# Altium footprint library CONN_RJ.PcbLib: 38 footprints (part 1 of 3)
Each footprint in its own frame and in the unit in brackets; x right, y up, seen from the top. Pads: shape width x height; smd on the part's side, far side on the other; paste and mask are expansions set on the pad; w line width, h text height; cw(c..) or ccw(c..) is an arc to the next point about the centre after c.
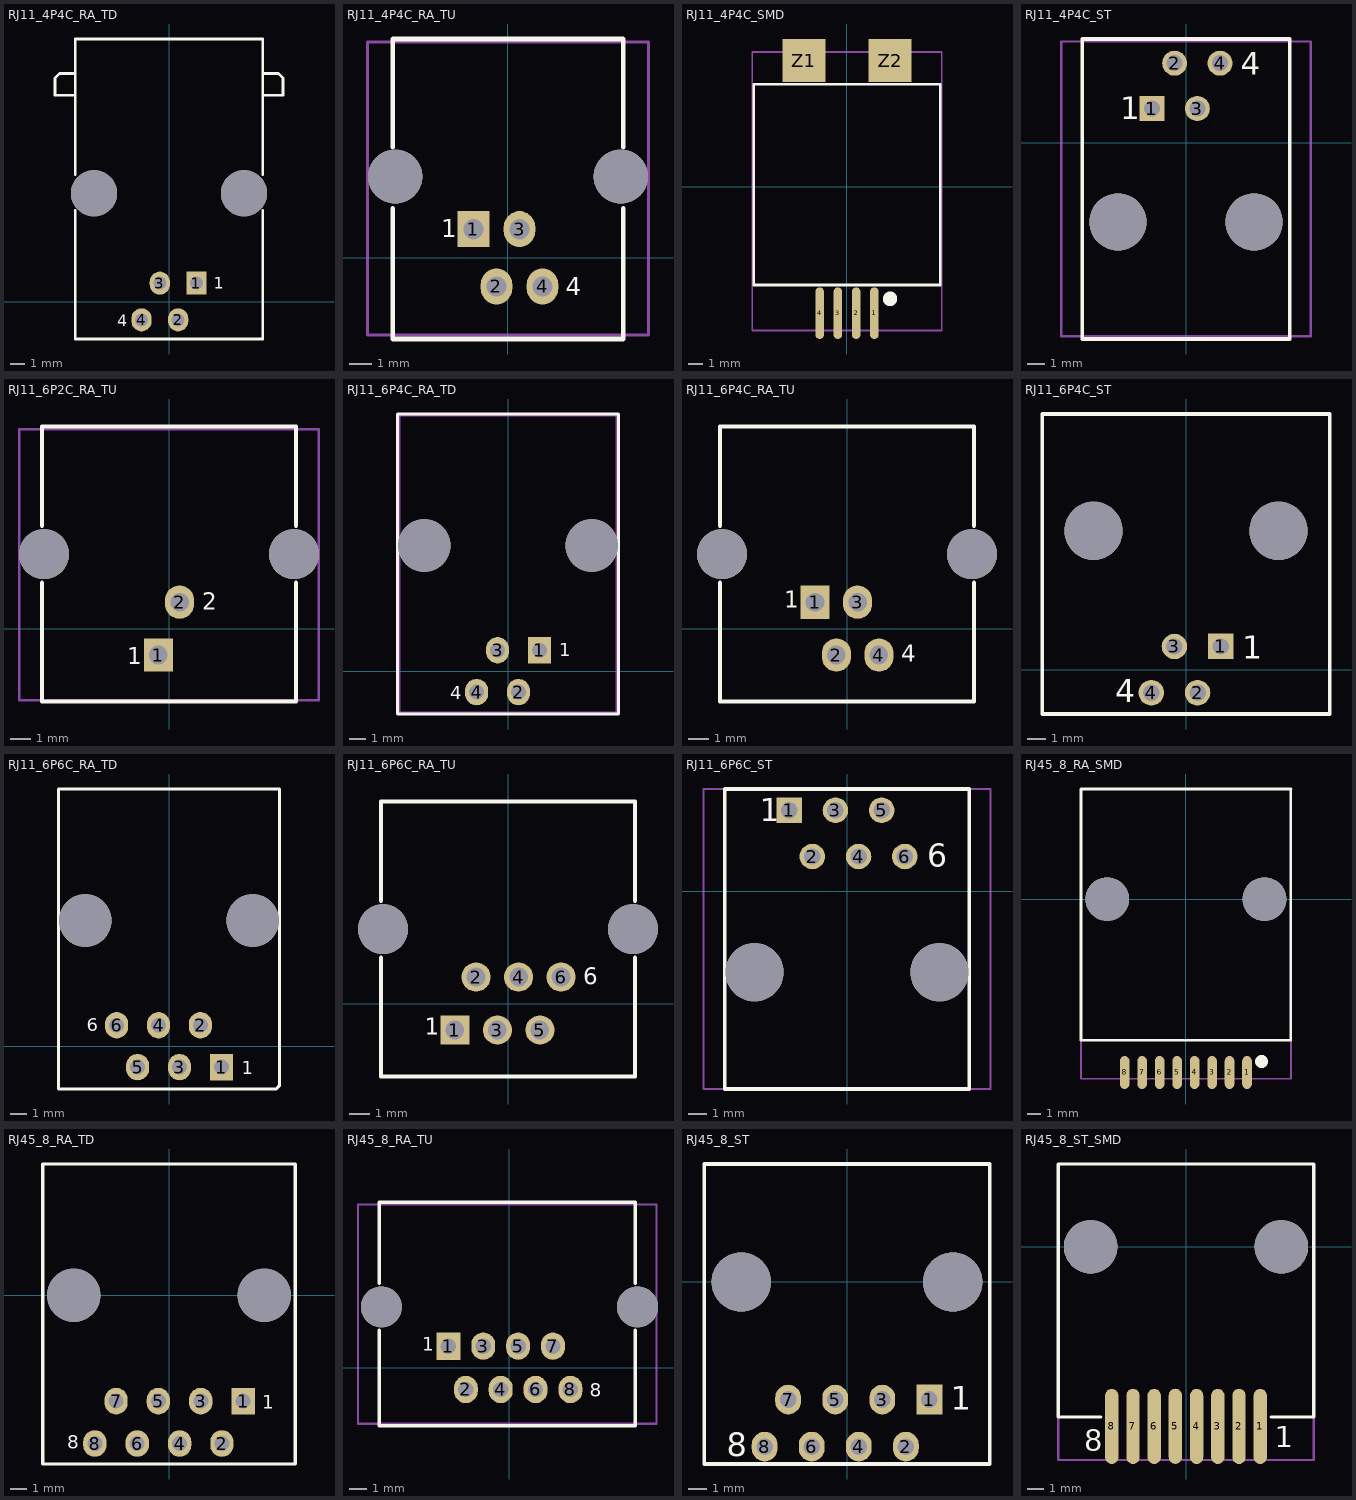
[diagram p0: the footprints below, top view; thin cyan lines are the x and y axes]

## RJ11_4P4C_RA_TD [mm] "RJ11 4P4C, RightAngle, TabDown"
height 14.5
pads (6):
  rect 1.4x1.6 hole 0.9: 1(1.905,1.27)
  oval 1.4x1.6 hole 0.9: 2(0.635,-1.27) 3(-0.635,1.27) 4(-1.905,-1.27)
  round 3.2 hole 3.2 unplated: ""(-5.2,7.5) ""(5.2,7.5)
Top Overlay:
  lines w0.2: -6.5,6.3 -6.5,-2.6 6.5,-2.6 6.5,6.3 ; -6.5,8.8 -6.5,18.2 6.5,18.2 6.5,8.8 ; -6.5,14.3 -7.9,14.3 -7.9,15.5 -7.6,15.8 -6.5,15.8 ; 6.5,14.3 7.9,14.3 7.9,15.5 7.6,15.8 6.5,15.8
  text "4" at -3.6,-1.7 h0.8
  text "1" at 3.1,0.9 h0.8
3D body "ACC-M-RJE02-164-0X21-REVT1.step": height 15.83, standoff -3.82, extent -7.775,-2.5 7.975,18.07

## RJ11_4P4C_RA_TU [mm] "RJ11 4P4C, RightAngle, TabUp"
height 14.5
pads (6):
  rect 1.4x1.6 hole 0.9: 1(-1.53,1.27)
  oval 1.4x1.6 hole 0.9: 2(-0.51,-1.27) 3(0.51,1.27) 4(1.53,-1.27)
  round 2.4 hole 2.4 unplated: ""(-5,3.6) ""(5,3.6)
Top Overlay:
  lines w0.2: -5.1,2.2 -5.1,-3.6 5.1,-3.6 5.1,2.2 ; -5.1,4.9 -5.1,9.7 5.1,9.7 5.1,4.9
  text "1" at -2.95,0.9 h0.8
  text "4" at 2.55,-1.65 h0.8
Mechanical 13:
  lines w0.127: -6.23,-3.43 -6.23,9.57 6.231,9.57 6.231,-3.43 -6.23,-3.43
3D body "615004143821.stp": height 3, standoff -14.95, extent -6.275,-3.43 6.275,9.57

## RJ11_4P4C_SMD [mm] "RJ11 4P4C, Tab Up, Straight, Top Entry_4P4C T&R with Mylar for Pick & Place"
height 12.9
pads (6):
  oval 0.6x3.6 smd: 1(1.905,-8.8) 2(0.635,-8.8) 3(-0.635,-8.8) 4(-1.905,-8.8)
  rect 3x3 smd: Z1(-3,8.8) Z2(3,8.8)
Top Overlay:
  circle w0.8: c3,-7.8 r0.1
  lines w0.2: -6.5,-6.85 6.5,-6.85 6.5,7.15 -6.5,7.15 -6.5,-6.85
Mechanical 13:
  lines w0.127: -6.6,-10 -6.6,9.4 6.6,9.4 6.6,-10 -6.6,-10
3D body "634104149621.stp": height 13, standoff 0.02, extent -6.6,-10 6.6,9.4

## RJ11_4P4C_ST [mm] "RJ11 4P4C, Straight, WURTH 615004144021"
height 15.88
pads (6):
  rect 1.4x1.4 hole 0.9: 1(-1.905,1.905)
  round 1.4 hole 0.9: 2(-0.635,4.445) 3(0.635,1.905) 4(1.905,4.445)
  round 3.2 hole 3.2 unplated: ""(-3.81,-4.445) ""(3.81,-4.445)
Top Overlay:
  lines w0.2: -5.8,-11 -5.8,5.8 5.8,5.8 5.8,-11 -5.8,-11
  text "4" at 3.06,3.805 h1.27
  text "1" at -3.69,1.305 h1.27
Mechanical 13:
  lines w0.127: -6.985,-10.845 -6.985,5.655 6.985,5.655 6.985,-10.845 -6.985,-10.845
3D body "615004144021.stp": height 16.36, standoff -3.32, extent -6.985,-10.845 6.985,5.655

## RJ11_6P2C_RA_TU [mm] "RJ11, 6P2C, RightAngle TabUp, WURTH 615002138421"
height 14.5
pads (4):
  rect 1.4x1.6 hole 0.9: 1(-0.51,-1.27)
  oval 1.4x1.6 hole 0.9: 2(0.51,1.27)
  round 2.4 hole 2.4 unplated: ""(-6,3.57) ""(6,3.57)
Top Overlay:
  lines w0.2: -6.1,2.2 -6.1,-3.5 6.1,-3.5 6.1,2.2 ; -6.1,4.94 -6.1,9.7 6.1,9.7 6.1,4.94
  text "1" at -2,-1.7 h0.8
  text "2" at 1.6,0.9 h0.8
Mechanical 13:
  lines w0.12: -7.19,-3.43 7.19,-3.43 7.19,9.57 -7.19,9.57 -7.19,-3.43
3D body "615002138421.stp": height 14.51, standoff -3.39, extent -7.19,-3.43 7.19,9.57

## RJ11_6P4C_RA_TD [mm] "RJ11 6P4C, RightAngle, TabDown, WURTH 615004141121"
height 11.65
pads (6):
  rect 1.4x1.6 hole 0.9: 1(1.905,1.27)
  oval 1.4x1.6 hole 0.9: 2(0.635,-1.27) 3(-0.635,1.27) 4(-1.905,-1.27)
  round 3.2 hole 3.2 unplated: ""(-5.08,7.62) ""(5.08,7.62)
Top Overlay:
  lines w0.2: -6.7,-2.6 -6.7,15.6 6.7,15.6 6.7,-2.6 -6.7,-2.6
  text "4" at -3.5,-1.7 h0.8
  text "1" at 3.1,0.9 h0.8
Mechanical 15:
  lines w0.127: -6.6,-2.5 6.6,-2.5 6.6,15.5 -6.6,15.5 -6.6,-2.5
3D body "615004141121.stp": height 2.87, standoff -12.08, extent -6.6,-2.5 6.6,15.5

## RJ11_6P4C_RA_TU [mm] "RJ11, 6P4C, RightAngle TabUp, WURTH 615004138421"
height 14.5
pads (6):
  rect 1.4x1.6 hole 0.9: 1(-1.53,1.27)
  oval 1.4x1.6 hole 0.9: 2(-0.51,-1.27) 3(0.51,1.27) 4(1.53,-1.27)
  round 2.4 hole 2.4 unplated: ""(-6,3.57) ""(6,3.57)
Top Overlay:
  lines w0.2: -6.1,2.2 -6.1,-3.5 6.1,-3.5 6.1,2.2 ; -6.1,4.94 -6.1,9.7 6.1,9.7 6.1,4.94
  text "1" at -3,1 h0.8
  text "4" at 2.6,-1.6 h0.8
3D body "615004138421.stp": height 2.97, standoff -14.93, extent -7.189,-3.43 7.192,9.57

## RJ11_6P4C_ST [mm] "RJ11, 6P4C, Straight, WURTH 615004144121"
height 16.38
pads (6):
  rect 1.4x1.4 hole 0.9: 1(1.905,1.27)
  round 1.4 hole 0.9: 2(0.635,-1.27) 3(-0.635,1.27) 4(-1.905,-1.27)
  round 3.2 hole 3.2 unplated: ""(-5.08,7.62) ""(5.08,7.62)
Top Overlay:
  lines w0.2: -7.887,-2.44 -7.887,14.04 ; -7.887,-2.44 7.887,-2.44 ; -7.887,-2.44 -7.887,14.04 ; -7.887,-2.44 7.887,-2.44 ; -7.887,14.04 7.887,14.04 ; -7.887,14.04 7.887,14.04 ; 7.887,-2.44 7.887,14.04 ; 7.887,-2.44 7.887,14.04
  text "4" at -3.9,-1.8 h1.27
  text "1" at 3.1,0.6 h1.27
3D body "615004144121.stp": height 15.95, standoff -3.73, extent -7.813,-2.44 7.887,14.04

## RJ11_6P6C_RA_TD [mm] "RJ11 6P6C, RightAngle, TabDown, WURTH 615004141121"
height 11.65
pads (8):
  rect 1.4x1.6 hole 0.9: 1(3.175,-1.27)
  oval 1.4x1.6 hole 0.9: 2(1.905,1.27) 3(0.635,-1.27) 4(-0.635,1.27) 5(-1.905,-1.27) 6(-3.175,1.27)
  round 3.2 hole 3.2 unplated: ""(-5.08,7.62) ""(5.08,7.62)
Top Overlay:
  lines w0.2: -6.7,-2.6 -6.7,15.6 6.7,15.6 6.7,-2.4 6.5,-2.6 -6.7,-2.6
  text "6" at -5,0.9 h0.8
  text "1" at 4.4,-1.7 h0.8
3D body "615006141121.stp": height 11.66, standoff -3.29, extent -6.6,-2.5 6.6,15.5

## RJ11_6P6C_RA_TU [mm] "RJ11, 6P6C, RightAngle TabUp, WURTH 615006138421"
height 14.5
pads (8):
  rect 1.4x1.4 hole 0.9: 1(-2.55,-1.27)
  round 1.4 hole 0.9: 2(-1.53,1.27) 3(-0.51,-1.27) 4(0.51,1.27) 5(1.53,-1.27) 6(2.55,1.27)
  round 2.4 hole 2.4 unplated: ""(-6,3.57) ""(6,3.57)
Top Overlay:
  lines w0.2: -6.1,2.2 -6.1,-3.5 6.1,-3.5 6.1,2.2 ; -6.1,4.94 -6.1,9.7 6.1,9.7 6.1,4.94
  text "1" at -4,-1.5 h0.8
  text "6" at 3.6,0.9 h0.8
3D body "615006138421.stp": height 14.51, standoff -3.39, extent -7.19,-3.43 7.19,9.57

## RJ11_6P6C_ST [mm] "RJ11, 6P6C, Straight, WURTH 615006144121"
height 16.38
pads (8):
  rect 1.4x1.4 hole 0.9: 1(-3.175,4.445)
  round 1.4 hole 0.9: 2(-1.905,1.905) 3(-0.635,4.445) 4(0.635,1.905) 5(1.905,4.445) 6(3.175,1.905)
  round 3.2 hole 3.2 unplated: ""(-5.08,-4.445) ""(5.08,-4.445)
Top Overlay:
  lines w0.2: -6.725,-10.865 -6.725,5.615 6.725,5.615 6.725,-10.865 -6.725,-10.865
  text "6" at 4.4,1.335 h1.27
  text "1" at -4.8,3.835 h1.27
Mechanical 13:
  lines w0.127: -7.887,-10.865 -7.887,5.615 7.887,5.615 7.887,-10.865 -7.887,-10.865
3D body "615006144121.stp": height 15.95, standoff -3.73, extent -7.887,-10.865 7.813,5.615

## RJ45_8_RA_SMD [mm] "RJ45 8P8C, RightAngle, TabDown SMD, WURTH 634008137221"
height 12.6
pads (10):
  oval 0.7x2.4 smd: 1(4.445,-12.6) 2(3.175,-12.6) 3(1.905,-12.6) 4(0.635,-12.6) 5(-0.635,-12.6) 6(-1.905,-12.6) 7(-3.175,-12.6) 8(-4.445,-12.6)
  round 3.17 hole 3.17 unplated: ""(-5.715,0) ""(5.715,0)
Top Overlay:
  circle w0.5: c5.5,-11.8 r0.224
  lines w0.2: -7.62,-8 -7.62,8 ; 7.62,8 7.62,-10.26 -7.62,-10.26 -7.62,8 ; 7.64,8 -7.62,8
Mechanical 13:
  lines w0.12: 7.64,8 -7.62,8 -7.62,-13.059 7.62,-13.059 7.64,-13.039 7.64,8 ; 7.64,8 7.64,8
3D body "634008137221.stp": height 2.96, standoff -13.4, extent -7.62,-13.059 7.62,8

## RJ45_8_RA_TD [mm] "RJ45 8P8C, RightAngle, TabDown, WURTH 615008137121"
height 11.65
pads (10):
  rect 1.4x1.6 hole 0.9: 1(4.445,-6.35)
  oval 1.4x1.6 hole 0.9: 2(3.175,-8.89) 3(1.905,-6.35) 4(0.635,-8.89) 5(-0.635,-6.35) 6(-1.905,-8.89) 7(-3.175,-6.35) 8(-4.445,-8.89)
  round 3.2 hole 3.2 unplated: ""(-5.715,0) ""(5.715,0)
Top Overlay:
  lines w0.2: -7.575,-10.12 -7.575,7.88 7.575,7.88 7.575,-10.12 -7.575,-10.12
  text "8" at -6.1,-9.2 h0.8
  text "1" at 5.6,-6.8 h0.8
3D body "615008137121.stp": height 11.69, standoff -4.04, extent -7.575,-10.12 7.575,7.88

## RJ45_8_RA_TU [mm] "RJ45 8P8C, RightAngle, TabUp, WURTH 615008148521"
height 14.5
pads (10):
  rect 1.4x1.6 hole 0.9: 1(-3.57,1.27)
  oval 1.4x1.6 hole 0.9: 2(-2.55,-1.27) 3(-1.53,1.27) 4(-0.51,-1.27) 5(0.51,1.27) 6(1.53,-1.27) 7(2.55,1.27) 8(3.57,-1.27)
  round 2.4 hole 2.4 unplated: ""(-7.5,3.57) ""(7.5,3.57)
Top Overlay:
  lines w0.2: -7.625,2.2 -7.625,-3.4 7.375,-3.4 7.375,2.2 ; -7.625,4.94 -7.625,9.7 7.375,9.7 7.375,4.94
  text "1" at -5.1,1 h0.8
  text "8" at 4.7,-1.7 h0.8
Mechanical 13:
  lines w0.127: -8.865,-3.28 -8.865,9.57 8.615,9.57 8.615,-3.28 -8.865,-3.28
3D body "615008148521.stp": height 14.51, standoff -3.29, extent -8.865,-3.28 8.615,9.57

## RJ45_8_ST [mm] "RJ45 8P8C, Straight, WURTH  615008138021"
height 16.4
pads (10):
  rect 1.4x1.6 hole 0.9: 1(4.445,-6.35)
  oval 1.4x1.6 hole 0.9: 2(3.175,-8.89) 3(1.905,-6.35) 4(0.635,-8.89) 5(-0.635,-6.35) 6(-1.905,-8.89) 7(-3.175,-6.35) 8(-4.445,-8.89)
  round 3.2 hole 3.2 unplated: ""(-5.715,0) ""(5.715,0)
Top Overlay:
  lines w0.2: -7.708,-9.83 -7.708,6.37 ; -7.708,-9.83 7.707,-9.83 ; -7.708,-9.83 -7.708,6.37 ; -7.708,-9.83 7.707,-9.83 ; -7.708,6.37 7.707,6.37 ; -7.708,6.37 7.707,6.37 ; 7.707,-9.83 7.707,6.37 ; 7.707,-9.83 7.707,6.37
  text "8" at -6.5,-9.4 h1.27
  text "1" at 5.6,-6.9 h1.27
3D body "615008138021.stp": height 2.99, standoff -16.91, extent -7.708,-9.83 7.692,6.37

## RJ45_8_ST_SMD [mm] "RJ45 8P8C, Straight SMD, WURTH 634008138121"
height 15.15
pads (10):
  oval 0.8x4.5 smd: 1(4.445,-10.75) 2(3.175,-10.75) 3(1.905,-10.75) 4(0.635,-10.75) 5(-0.635,-10.742) 6(-1.905,-10.75) 7(-3.175,-10.75) 8(-4.445,-10.75)
  round 3.2 hole 3.2 unplated: ""(-5.715,0) ""(5.715,0)
Top Overlay:
  lines w0.2: -5.1,-10.19 -7.645,-10.19 -7.645,4.96 7.645,4.96 7.645,-10.19 5.1,-10.19
  text "1" at 5.3,-12 h1.27
  text "8" at -6.1,-12.2 h1.27
Mechanical 13:
  lines w0.127: -7.645,-12.75 7.645,-12.75 7.645,4.96 -7.645,4.96 -7.645,-12.75
3D body "634008138121.stp": height 13.08, standoff -2.62, extent -7.62,-12.49 7.62,4.96